# Altium footprint library PcbLib1.PcbLib: 42 footprints (part 3 of 3)
Each footprint in its own frame and in the unit in brackets; x right, y up, seen from the top. Pads: shape width x height; smd on the part's side, far side on the other; paste and mask are expansions set on the pad; w line width, h text height; cw(c..) or ccw(c..) is an arc to the next point about the centre after c.
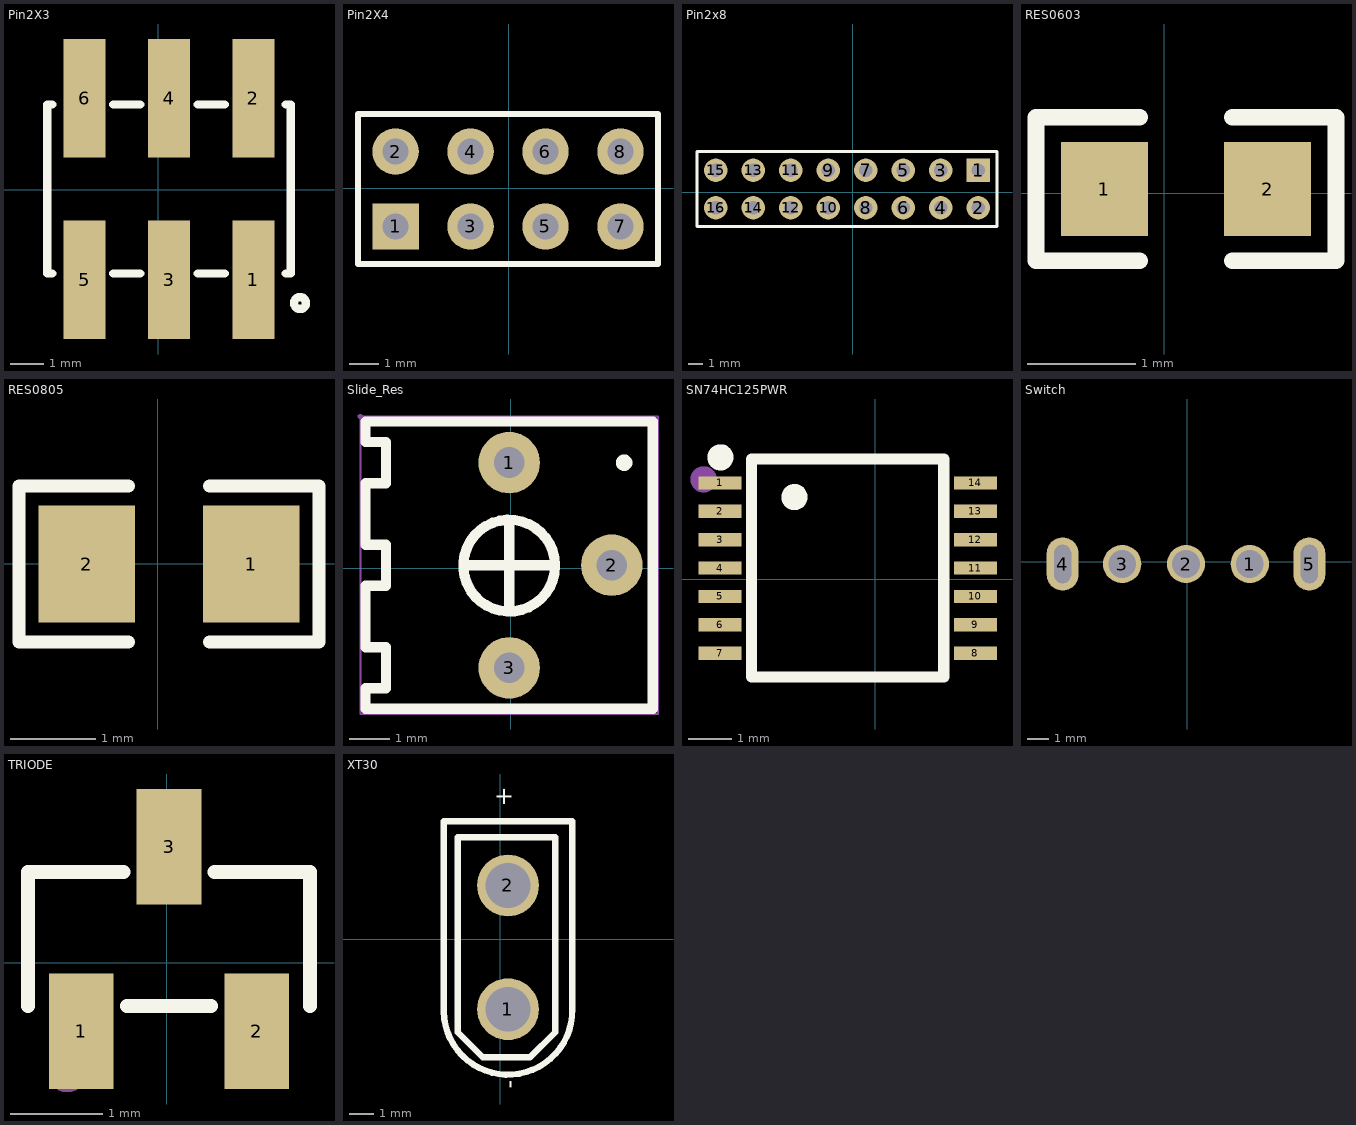
[diagram p2: the footprints below, top view; thin cyan lines are the x and y axes]

## Pin2X3 [mil]
pads (6):
  rect 50x140.16 smd: 1(113,-106.48) 2(113,108.48) 3(13,-106.48) 4(13,108.48) 5(-87,-106.48) 6(-87,108.48)
Top Overlay:
  circle w10: c168,-134 r7.07
  lines w10: -125.04,-99 -130.94,-99 -130.94,101 -125.04,101 ; -52.9,-99 -21.1,-99 ; -52.9,101 -21.1,101 ; 47.1,-99 78.9,-99 ; 47.1,101 78.9,101 ; 151.04,-99 156.94,-99 156.94,101 151.04,101
3D body "H2.step": height 533.86, standoff 0, extent -135.39,-152.79 165.01,122.8

## Pin2X4 [mil]
pads (8):
  rect 62x62 hole 35: 1(-151,-51)
  round 62 hole 35: 2(-151,49) 3(-51,-51) 4(-51,49) 5(49,-51) 6(49,49) 7(149,-51) 8(149,49)
Top Overlay:
  lines w8: -201,-101 -201,99 199,99 199,-101 -201,-101
3D body "J13.step": height 332.76, standoff -120, extent -199.99,-99.99 200.04,100.01

## Pin2x8 [mil]
pads (16):
  rect 62x62 hole 35: 1(335,59)
  round 62 hole 35: 2(335,-41) 3(235,59) 4(235,-41) 5(135,59) 6(135,-41) 7(35,59) 8(35,-41) 9(-65,59) 10(-65,-41) 11(-165,59) 12(-165,-41) 13(-265,59) 14(-265,-41) 15(-365,59) 16(-365,-41)
Top Overlay:
  lines w8: -415,-91 385,-91 385,109 -415,109 -415,-91
3D body "J12.step": height 332.76, standoff -120, extent -414.99,-94.99 385.4,105.01

## RES0603 [mil]
pads (2):
  rect 31.75x34.02 smd: 1(-21.8,1.59) 2(37.51,1.59)
Top Overlay:
  lines w6: -8.92,-24.42 -46.67,-24.42 -46.67,27.6 -8.92,27.6 ; 24.64,-24.42 62.39,-24.42 62.39,27.6 24.64,27.6
Top Paste:
  region: 54.91,19.31 23.41,19.31 21.44,17.34 21.44,8.36 36.01,8.36 36.01,-4.63 21.44,-4.63 21.44,-14.16 23.41,-16.13 54.91,-16.13 56.87,-14.16 56.87,17.34
  region: -6.12,17.34 -6.12,8.36 -21.08,8.36 -21.08,-4.63 -6.12,-4.63 -6.12,-14.16 -8.09,-16.13 -39.19,-16.13 -41.16,-14.16 -41.16,17.34 -39.19,19.31 -8.09,19.31
3D body "R17.step": height 31.5, standoff 0, extent -21.49,-15.74 41.5,15.75

## RES0805 [mil]
pads (2):
  rect 44.59x54.21 smd: 1(43.14,-0.2) 2(-32.94,-0.2)
Top Overlay:
  lines w6: -13.65,-36.31 -64.24,-36.31 -64.24,35.91 -13.65,35.91 ; 23.85,-36.31 74.44,-36.31 74.44,35.91 23.85,35.91
Top Paste:
  region: -12.62,25 -12.62,8.46 -30.14,8.46 -30.14,-9.25 -12.81,-9.25 -12.62,-25.4 -14.59,-27.36 -59.86,-27.36 -61.83,-25.4 -61.83,25 -59.86,26.97 -14.59,26.97
  region: 72.03,25 72.03,-25.4 70.06,-27.36 24.79,-27.36 22.82,-25.4 22.62,-9.25 40.34,-9.25 40.34,8.46 23.01,8.46 22.82,25 24.79,26.97 70.06,26.97
3D body "RES0805.step": height 24.02, standoff 0, extent -36.56,-24.88 42.18,26.34

## Slide_Res [mil]
pads (3):
  round 60 hole 30 mask+2: 1(-1.5,102.9) 2(98.5,2.9) 3(-1.5,-97.1)
Top Overlay:
  lines w10: -41.5,2.9 38.5,2.9 ; -1.5,-37.1 -1.5,42.9 ; 18.5,-137.1 138.5,-137.1 138.5,142.9 18.5,142.9 -121.5,142.9 -141.5,142.9 -141.5,122.9 -121.5,122.9 -121.5,82.9 -141.5,82.9 -141.5,22.9 -121.5,22.9 -121.5,-17.1 -141.5,-17.1 -141.5,-77.1 -121.5,-77.1 -121.5,-117.1 -141.5,-117.1 -141.5,-137.1 -121.5,-137.1 38.5,-137.1 ; 43.2,2.1 cw(c-1.52,2.5) 43.2,2.9 ; 113.5,102.8 cw(c110.5,102.85) 113.5,102.9
Mechanical 15:
  region: -146.5,145.5 -145.51,145.5 -144.1,146.91 -144.1,148.89 -145.51,150.3 -146.5,150.3 -147.49,150.3 -148.9,148.89 -148.9,146.91 -147.49,145.5 -146.5,145.5
  region: -1.5,91.8 0.71,91.8 4.79,93.49 7.91,96.61 9.6,100.69 9.6,105.11 7.91,109.19 4.79,112.31 0.71,114 -1.5,114 -3.71,114 -7.79,112.31 -10.91,109.19 -12.6,105.11 -12.6,100.69 -10.91,96.61 -7.79,93.49 -3.71,91.8 -1.5,91.8
  region: 98.5,-8.2 100.71,-8.2 104.79,-6.51 107.91,-3.39 109.6,0.69 109.6,5.11 107.91,9.19 104.79,12.31 100.71,14 98.5,14 96.29,14 92.21,12.31 89.09,9.19 87.4,5.11 87.4,0.69 89.09,-3.39 92.21,-6.51 96.29,-8.2 98.5,-8.2
  region: -1.5,-108.2 0.71,-108.2 4.79,-106.51 7.91,-103.39 9.6,-99.31 9.6,-94.89 7.91,-90.81 4.79,-87.69 0.71,-86 -1.5,-86 -3.71,-86 -7.79,-87.69 -10.91,-90.81 -12.6,-94.89 -12.6,-99.31 -10.91,-103.39 -7.79,-106.51 -3.71,-108.2 -1.5,-108.2
  lines w2: -146.5,-142.1 -146.5,147.9 143.5,147.9 143.5,-142.1 -146.5,-142.1
3D body "slide_res.step": height 183.8, standoff -142.15, extent -142.94,-133.12 136.6,138.51

## SN74HC125PWR [mil]
pads (14):
  rect 39x12 smd: 1(-139.92,86.77) 2(-139.92,61.18) 3(-139.92,35.59) 4(-139.92,10) 5(-139.92,-15.59) 6(-139.92,-41.18) 7(-139.92,-66.77) 8(90.39,-66.77) 9(90.39,-41.18) 10(90.39,-15.59) 11(90.39,10) 12(90.39,35.59) 13(90.39,61.18) 14(90.39,86.77)
Top Overlay:
  circle w11.81: c-72.76,74 r5.91
  circle w11.81: c-139.6,109.85 r5.91
  lines w10: -111.38,-88.42 61.85,-88.42 61.85,108.43 -111.38,108.43 -111.38,-88.42
Mechanical 15:
  circle w11.81: c-154.76,90 r5.91
3D body "U6.step": height 43.31, standoff 0, extent -143.35,-88.43 93.36,108.42

## Switch [mm]
pads (5):
  round 1.8 hole 1.3: 1(2.93,-0.107) 2(-0.07,-0.107) 3(-3.07,-0.107)
  oval 1.5x2.5 hole 0.8 slot 1.8 at 90 deg: 4(-5.87,-0.107) 5(5.73,-0.107)
Bottom Overlay:
  lines w0.254: -6.07,-1.567 -6.07,-2.907 5.93,-2.907 5.93,-1.567 ; -6.07,1.354 -6.07,2.693 5.93,2.693 5.93,1.354 ; -3.88,-0.895 -3.88,-2.139 3.486,-2.139 3.486,-1.091 ; -3.88,0.682 -3.88,1.925 3.486,1.925 3.486,0.878 ; -0.07,-1.238 -0.07,-1.631 2.978,-1.631 2.978,-1.237 ; -0.07,1.024 -0.07,1.417 2.978,1.417 2.978,1.023 ; 0.472,-1.631 0.472,-1.099 ; 0.955,-1.631 0.955,-0.581 ; 0.955,0.367 0.955,1.417 ; 1.454,-1.631 1.454,1.417 ; 1.971,-1.631 1.971,-0.705 ; 1.971,0.492 1.971,1.417 ; 2.479,-1.631 2.479,-1.144 ; 2.479,0.931 2.479,1.417
3D body "Switch.step": height 11.31, standoff -3.6, extent -6.119,-3.272 5.979,3.059

## TRIODE [mm]
pads (3):
  rect 0.7x1.25 smd: 1(-0.927,-0.744) 2(0.973,-0.744) 3(0.023,1.256)
Top Overlay:
  lines w0.152: -1.503,-0.471 -1.503,0.982 -0.471,0.982 ; -0.432,-0.471 0.479,-0.471 ; 0.518,0.982 1.549,0.982 1.549,-0.471
Mechanical 15:
  circle w0.2: c-1.077,-1.204 r0.1
3D body "Q2.step": height 1.05, standoff 0, extent -1.423,-0.996 1.47,1.504

## XT30 [mm]
pads (2):
  round 2.5 hole 1.8: 1(0.305,-2.822) 2(0.305,2.178)
Top Overlay:
  lines w0.254: -2.295,-2.919 ccw(c0.305,-2.866) 2.905,-2.828 2.905,4.778 -2.295,4.778 -2.295,-2.919 ; -1.727,-3.751 -0.711,-4.767 1.194,-4.767 2.21,-3.751 2.21,4.123 -1.727,4.123 -1.727,-3.751
  text "-" at 0.686,-6.045 h0.71
  text "+" at 0.459,5.365 h0.71
3D body "CN4.step": height 10.7, standoff -2, extent -2.295,-5.354 2.905,4.846
3D body: height 0.25, standoff 0, extent 5.842,-0.381 5.842,-0.381
3D body: height 0.25, standoff 0, extent 5.842,-0.381 5.842,-0.381
3D body: height 0.25, standoff 0, extent 5.842,-0.381 5.842,-0.381